# Altium footprint library 陪测板.PcbLib: 72 footprints (part 1 of 5)
Each footprint in its own frame and in the unit in brackets; x right, y up, seen from the top. Pads: shape width x height; smd on the part's side, far side on the other; paste and mask are expansions set on the pad; w line width, h text height; cw(c..) or ccw(c..) is an arc to the next point about the centre after c.
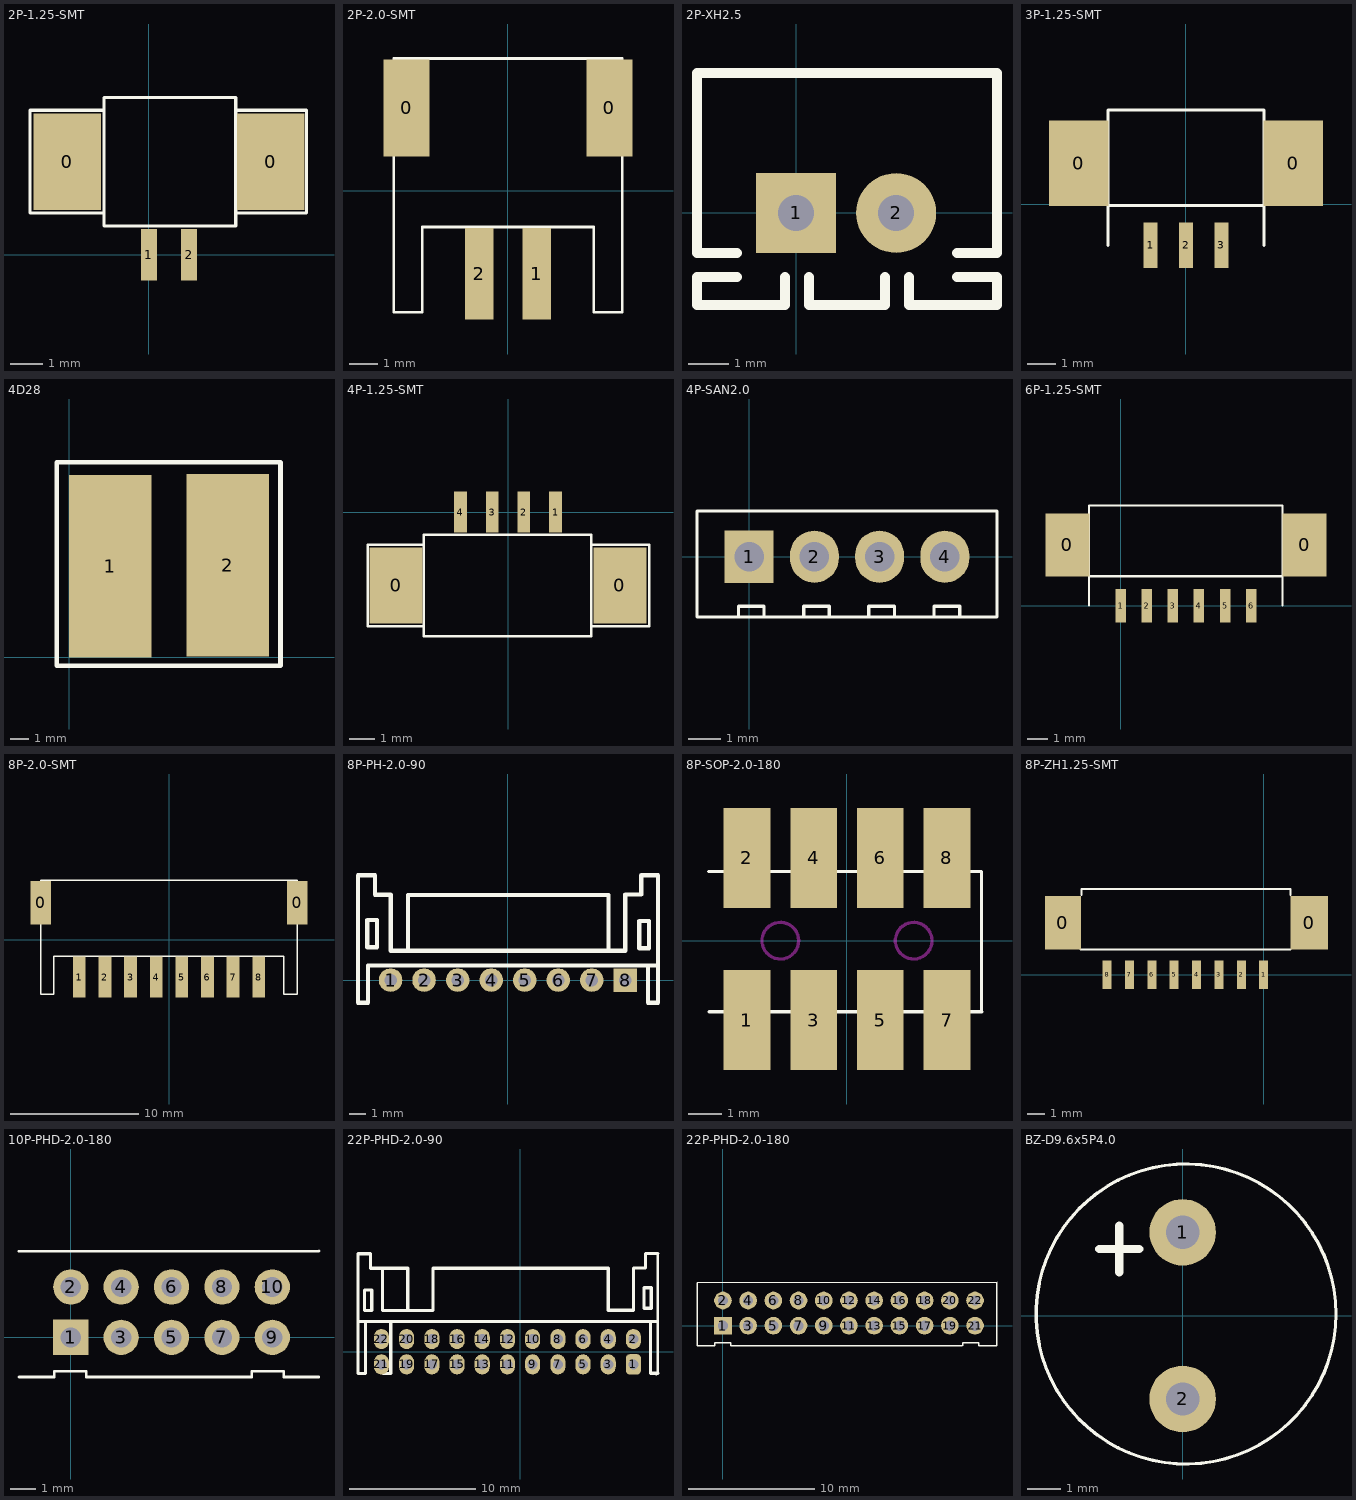
[diagram p0: the footprints below, top view; thin cyan lines are the x and y axes]

## 2P-1.25-SMT [mm]
pads (4):
  rect 2.1x3 smd: 0(-2.54,2.896) 0(3.79,2.896)
  rect 0.5x1.6 smd: 1(0,0) 2(1.25,0)
Top Overlay:
  lines w0.1: -1.4,4.5 -3.7,4.5 -3.7,1.3 -1.4,1.3 ; 2.7,1.3 4.9,1.3 4.9,4.5 2.7,4.5 ; -1.4,1.3 -1.4,0.9 2.7,0.9 2.7,4.9 -1.4,4.9 -1.4,1.3
3D body: height 0.5, standoff 0, extent -1.4,0.9 2.7,4.9
3D body: height 4, standoff 3.5, extent -1.4,0.8 2.7,4.9
3D body: height 4, standoff 0, extent 2.4,0.9 2.7,4.9
3D body: height 4, standoff 0, extent -1.4,0.9 -1.1,4.9
3D body: height 2, standoff 0, extent 2.63,1.3 4.93,4.5
3D body: height 2, standoff 0, extent -3.7,1.3 -1.4,4.5
3D body: height 0.3, standoff 0, extent 0.889,-0.813 1.6,1.4
3D body: height 0.3, standoff 0, extent -0.356,-0.813 0.356,1.4
3D body: height 4, standoff 0, extent -1.3,0.9 2.7,1.2

## 2P-2.0-SMT [mm]
height 5.6
pads (4):
  rect 1.6x3.4 smd: 0(-3.55,2.9) 0(3.55,2.9)
  rect 1x3.2 smd: 1(1,-2.9) 2(-1,-2.9)
Top Overlay:
  lines w0.1: -2.93,4.628 4,4.628 4,-4.25 3,-4.25 3,-1.265 -0.25,-1.265 ; -0.219,-1.265 -3,-1.265 -3,-4.25 -4,-4.25 -4,4.628 2.93,4.628
3D body: height 5.6, standoff 0, extent -4,-1.275 4,4.628
3D body: height 0.3, standoff 0, extent -1.5,-3.713 -0.5,-0.55
3D body: height 0.3, standoff 0, extent 0.5,-3.713 1.5,-0.55
3D body: height 3.2, standoff 0, extent -4,-3.238 -3.3,-0.975
3D body: height 3.2, standoff 0, extent 3.225,-3.238 3.975,-0.975

## 2P-XH2.5 [mm]
pads (2):
  rect 2x2 hole 0.9: 1(0,0)
  round 2 hole 0.9: 2(2.5,0)
Top Overlay:
  lines w0.254: -1.48,-1.6 -2.48,-1.6 -2.48,-2.3 -0.58,-2.3 ; -1.48,-1 -2.48,-1 -2.48,3.5 5.02,3.5 5.02,-1 4.02,-1 ; -0.88,-2.3 -0.28,-2.3 -0.28,-1.6 ; 0.32,-1.6 0.32,-2.3 0.62,-2.3 1.62,-2.3 2.22,-2.3 2.22,-1.6 ; 2.82,-1.6 2.82,-2.3 3.12,-2.3 5.02,-2.3 5.02,-1.6 4.02,-1.6
3D body "2PIN-XH2.5.STEP": height 5.9, standoff -3.47, extent -2.43,-2.372 4.97,3.378

## 3P-1.25-SMT [mm]
pads (5):
  rect 2.1x3 smd: 0(-3.79,1.448) 0(3.79,1.448)
  rect 0.5x1.6 smd: 1(-1.25,-1.448) 2(0,-1.448) 3(1.25,-1.448)
Top Overlay:
  lines w0.1: -2.75,-1.448 -2.75,2.997 -2.75,3.326 2.75,3.326 2.75,-1.448 ; -2.75,-0.048 -1.25,-0.048 2.748,-0.048
3D body: height 0.3, standoff 0, extent 0.909,-2.261 1.62,-0.048
3D body: height 0.3, standoff 0, extent -0.361,-2.261 0.35,-0.048
3D body: height 0.3, standoff 0, extent -1.606,-2.261 -0.894,-0.048
3D body: height 3.7, standoff 0, extent -4.933,-0.152 4.875,3.378

## 4D28 [mm]
pads (2):
  rect 4.5x10 smd: 1(2.261,5.004) 2(8.687,5.055)
Top Overlay:
  lines w0.254: -0.673,-0.457 -0.673,10.693 11.582,10.693 11.582,-0.457 -0.673,-0.457

## 4P-1.25-SMT [mm]
pads (6):
  rect 2.1x3 smd: 0(-4.415,-2.896) 0(4.415,-2.896)
  rect 0.5x1.6 smd: 1(1.875,0) 2(0.625,0) 3(-0.625,0) 4(-1.875,0)
Top Overlay:
  lines w0.1: -3.325,-4.5 -5.525,-4.5 -5.525,-1.3 -3.325,-1.3 ; -3.325,-0.9 -3.325,-4.9 3.275,-4.9 3.275,-1.3 ; -3.315,-0.9 3.275,-0.9 3.275,-1.3 ; 3.275,-4.5 5.575,-4.5 5.575,-1.3 3.275,-1.3
3D body: height 4, standoff 0, extent -3.325,-4.9 -3.025,-0.9
3D body: height 2, standoff 0, extent -5.555,-4.5 -3.255,-1.3
3D body: height 0.5, standoff 0, extent -3.286,-4.9 3.275,-0.9
3D body: height 4, standoff 3.5, extent -3.286,-4.9 3.275,-0.8
3D body: height 4, standoff 0, extent -3.322,-1.2 3.175,-0.9
3D body: height 4, standoff 0, extent 2.975,-4.9 3.275,-0.9
3D body: height 2, standoff 0, extent 3.275,-4.5 5.575,-1.3
3D body: height 0.3, standoff 0, extent 0.275,-1.4 0.986,0.813
3D body: height 0.3, standoff 0, extent 1.519,-1.4 2.231,0.813
3D body: height 0.3, standoff 0, extent -0.975,-1.4 -0.264,0.813
3D body: height 0.3, standoff 0, extent -2.225,-1.4 -1.514,0.813

## 4P-SAN2.0 [mm]
pads (4):
  rect 1.5x1.6 hole 0.9: 1(0,0)
  oval 1.5x1.6 hole 0.9: 2(2,0) 3(4,0) 4(6,0)
Top Overlay:
  lines w0.1: -0.33,-1.85 -0.33,-1.524 0.457,-1.524 0.457,-1.85 ; 1.67,-1.85 1.67,-1.524 2.457,-1.524 2.457,-1.85 ; 3.67,-1.85 3.67,-1.524 4.457,-1.524 4.457,-1.85 ; 5.67,-1.85 5.67,-1.524 6.457,-1.524 6.457,-1.85 ; 7.592,-1.85 7.6,-1.842 7.6,1.4 ; 7.595,-1.85 -1.6,-1.85 -1.6,1.4 7.595,1.4

## 6P-1.25-SMT [mm]
pads (8):
  rect 2.1x3 smd: 0(-2.54,2.896) 0(8.799,2.896)
  rect 0.5x1.6 smd: 1(0,0) 2(1.25,0) 3(2.5,0) 4(3.75,0) 5(5,0) 6(6.25,0)
Top Overlay:
  lines w0.1: -1.5,0 -1.5,4.445 -1.5,4.774 5.232,4.774 7.75,4.774 7.75,0 ; -1.5,1.4 0,1.4 5.25,1.4 7.75,1.4
3D body: height 3.7, standoff 0, extent -3.607,1.397 9.855,4.826
3D body: height 0.3, standoff 0, extent -0.356,-0.889 0.356,1.324
3D body: height 0.3, standoff 0, extent 0.889,-0.889 1.6,1.324
3D body: height 0.3, standoff 0, extent 2.134,-0.889 2.845,1.324
3D body: height 0.3, standoff 0, extent 3.404,-0.889 4.115,1.324
3D body: height 0.3, standoff 0, extent 4.648,-0.889 5.359,1.324
3D body: height 0.3, standoff 0, extent 5.893,-0.889 6.604,1.324

## 8P-2.0-SMT [mm]
pads (10):
  rect 1.6x3.4 smd: 0(-10,2.9) 0(10,2.9)
  rect 1x3.2 smd: 1(-7,-2.9) 2(-5,-2.9) 3(-3,-2.9) 4(-1,-2.9) 5(1,-2.9) 6(3,-2.9) 7(5,-2.9) 8(7,-2.9)
Top Overlay:
  lines w0.1: -8.93,4.628 10.018,4.628 10.018,-4.25 8.948,-4.25 8.948,-1.265 -6.25,-1.265 ; -6.219,-1.265 -9,-1.265 -9,-4.25 -10,-4.25 -10,4.628 -3.07,4.628
3D body: height 0.3, standoff 0, extent 6.511,-3.665 7.511,-0.503
3D body: height 0.3, standoff 0, extent 4.499,-3.649 5.499,-0.487
3D body: height 0.3, standoff 0, extent 2.498,-3.671 3.498,-0.508
3D body: height 0.3, standoff 0, extent 0.497,-3.692 1.497,-0.529
3D body: height 0.3, standoff 0, extent -1.504,-3.703 -0.504,-0.54
3D body: height 0.3, standoff 0, extent -3.378,-3.713 -2.378,-0.55
3D body: height 5.6, standoff 0, extent -10,-1.275 10.029,4.628
3D body: height 0.3, standoff 0, extent -7.5,-3.713 -6.5,-0.55
3D body: height 0.3, standoff 0, extent -5.5,-3.713 -4.5,-0.55
3D body: height 3.2, standoff 0, extent -10,-3.238 -9.3,-0.975
3D body: height 3.2, standoff 0, extent 9.269,-3.201 10.019,-0.939

## 8P-PH-2.0-90 [mm]
pads (8):
  round 1.4 hole 0.75: 1(-7,0) 2(-5,0) 3(-3,0) 4(-1,0) 5(1,0) 6(3,0) 7(5,0)
  rect 1.4x1.4 hole 0.75: 8(7,0)
Top Overlay:
  lines w0.254: -8.348,0.865 -4.35,0.865 8.95,0.865 ; -8.342,0.868 -8.342,-1.346 -8.942,-1.346 -8.942,6.254 -7.932,6.254 -7.932,5.085 -6.992,5.085 -6.992,1.757 ; -6.988,1.754 -3,1.754 7,1.754 7,5.107 7.95,5.107 7.95,6.25 8.95,6.25 8.95,-1.35 8.35,-1.35 8.35,0.865 ; -5.953,1.754 -5.953,5.081 5.877,5.081 ; 6,1.754 6,5.081 ; 8.377,0.865 8.827,0.865 ; -8.389,1.959 -8.389,3.585 -7.805,3.585 -7.805,1.959 -8.389,1.959 ; 7.832,1.906 8.417,1.906 8.417,3.532 7.832,3.532 7.832,1.906
3D body: height 5, standoff 0, extent -8.93,-1.35 8.95,6.25

## 8P-SOP-2.0-180 [mm]
pads (8):
  rect 1.4x3 smd: 1(-3,-2.381) 2(-3,2.483) 3(-1,-2.381) 4(-1,2.483) 5(1,-2.381) 6(1,2.483) 7(3,-2.381) 8(3,2.483)
Top Overlay:
  lines w0.1: -4.143,2.073 4.036,2.073 4.036,-2.118 ; -4.14,-2.134 4.039,-2.134
Keep-Out Layer:
  circle w0.1: c-2,0 r0.55
  circle w0.1: c2,0 r0.55
3D body: height 4.3, standoff 0, extent -4.1,-2.075 4,2.025

## 8P-ZH1.25-SMT [mm]
pads (10):
  rect 2x3 smd: 0(-11.219,2.896)
  rect 2.1x3 smd: 0(2.54,2.896)
  rect 0.5x1.6 smd: 1(0,0) 2(-1.25,0) 3(-2.5,0) 4(-3.75,0) 5(-5,0) 6(-6.25,0) 7(-7.5,0) 8(-8.75,0)
Top Overlay:
  lines w0.1: -10.25,1.4 -5.25,1.4 0,1.4 1.5,1.4 ; -10.185,4.775 -5.232,4.774 1.5,4.774 1.5,4.445 ; -10.184,4.445 -10.184,4.774
3D body: height 0.3, standoff 0, extent -9.144,-0.889 -8.382,0.889
3D body: height 0.3, standoff 0, extent -7.874,-0.889 -7.112,0.889
3D body: height 0.3, standoff 0, extent -6.604,-0.889 -5.842,0.889
3D body: height 0.3, standoff 0, extent -5.334,-0.889 -4.572,0.889
3D body: height 0.3, standoff 0, extent -4.064,-0.889 -3.302,0.889
3D body: height 0.3, standoff 0, extent -2.921,-0.889 -2.159,0.889
3D body: height 0.3, standoff 0, extent -1.651,-0.889 -0.889,0.889
3D body: height 0.3, standoff 0, extent -0.381,-0.889 0.381,0.889
3D body: height 3.7, standoff 0, extent -10.185,4.75 1.499,4.775
3D body: height 3.7, standoff 0, extent -10.211,1.397 1.499,4.775

## 10P-PHD-2.0-180 [mm]
height 1.2
pads (10):
  rect 1.4x1.4 hole 0.8: 1(0,0)
  round 1.4 hole 0.8: 2(0,2) 3(2,0) 4(2,2) 5(4,0) 6(4,2) 7(6,0) 8(6,2) 9(8,0) 10(8,2)
Top Overlay:
  lines w0.1: -2.057,-1.575 -0.66,-1.575 -0.66,-1.346 0.61,-1.346 0.61,-1.575 7.182,-1.575 7.182,-1.346 8.452,-1.346 8.452,-1.575 9.849,-1.575 ; -2.057,3.425 9.855,3.429
3D body "IDC10(2.0).STEP": height 6.5, standoff -2.6, extent -2.108,-1.575 9.892,3.425

## 22P-PHD-2.0-90 [mm]
pads (22):
  rrect50% 1.2x1.6 hole 0.8: 1(9,-1)
  oval 1.2x1.6 hole 0.8: 2(9,1) 3(7,-1) 4(7,1) 5(5,-1) 6(5,1) 7(3,-1) 8(3,1) 9(1,-1) 10(1,1) 11(-1,-1) 12(-1,1) 13(-3,-1) 14(-3,1) 15(-5,-1) 16(-5,1) 17(-7,-1) 18(-7,1) 19(-9,-1) 20(-9,1) 21(-11,-1) 22(-11,1)
Top Overlay:
  lines w0.2: -12.86,-1.726 -12.86,7.774 ; 10.795,-1.778 10.922,-1.651 10.922,7.789
  lines w0.254: -12.86,-1.726 -12.26,-1.726 -12.26,2.389 ; -12.86,7.774 -11.86,7.774 -11.86,6.631 -10.91,6.631 ; -12.818,2.404 -10.719,2.404 ; -10.86,-1.726 -10.26,-1.726 -10.26,2.389 ; -10.818,2.404 -8.719,2.404 ; -10.352,3.278 -9.768,3.278 ; -8.91,6.605 -8.91,3.278 ; -8.71,2.404 10.342,2.404 ; -6.91,6.605 -6.91,3.278 -8.91,3.278 ; -6.91,6.62 -3,6.62 7,6.62 7,3.293 9,3.293 9,6.645 9.95,6.645 9.95,7.789 10.95,7.789 ; 10.35,2.404 10.35,-1.711 10.95,-1.711 ; 10.377,2.404 10.827,2.404 ; -10.91,6.631 -8.91,6.631 -8.91,3.278 ; -10.91,6.631 -10.91,3.278 -8.91,3.278 ; -12.352,3.278 -11.768,3.278 -11.768,4.904 -12.352,4.904 -12.352,3.278 ; 9.832,3.445 10.417,3.445 10.417,5.071 9.832,5.071 9.832,3.445
3D body: height 5, standoff 0, extent -12.86,-1.726 10.95,7.789

## 22P-PHD-2.0-180 [mm]
pads (22):
  rect 1.4x1.4 hole 0.8: 1(0,0)
  round 1.4 hole 0.8: 2(0,2) 3(2,0) 4(2,2) 5(4,0) 6(4,2) 7(6,0) 8(6,2) 9(8,0) 10(8,2) 11(10,0) 12(10,2) 13(12,0) 14(12,2) 15(14,0) 16(14,2) 17(16,0) 18(16,2) 19(18,0) 20(18,2) 21(20,0) 22(20,2)
Top Overlay:
  lines w0.1: 18.974,-1.575 0.61,-1.575 0.61,-1.346 -0.66,-1.346 -0.66,-1.575 -2.057,-1.575 -2.057,3.425 21.742,3.433 ; 19.042,-1.575 19.042,-1.346 20.312,-1.346 20.312,-1.575 21.709,-1.575 21.709,3.43
3D body "IDC22(2.0).STEP": height 6.5, standoff -2.6, extent -2.184,-1.549 21.816,3.451

## BZ-D9.6x5P4.0 [mm]
height 5.5
pads (2):
  round 2 hole 1: 1(0,2.5) 2(0,-2.5)
Top Overlay:
  circle w0.1: c0.1,0.05 r4.5
  lines w0.254: -2.5,2 -1.3,2 ; -1.9,1.3 -1.9,2.7
3D body: height 5, standoff 0, extent -4.77,-4.774 4.825,4.824
3D body: height 0, standoff -4, extent -0.298,1.701 0.3,2.3
3D body: height 0, standoff -3, extent -0.298,-2.299 0.3,-1.7
3D body: height 5, standoff 0, extent -2.4,3.7 2.6,6.2